# Altium footprint library PcbLib1.PcbLib: 209 footprints (part 11 of 14)
Each footprint in its own frame and in the unit in brackets; x right, y up, seen from the top. Pads: shape width x height; smd on the part's side, far side on the other; paste and mask are expansions set on the pad; w line width, h text height; cw(c..) or ccw(c..) is an arc to the next point about the centre after c.
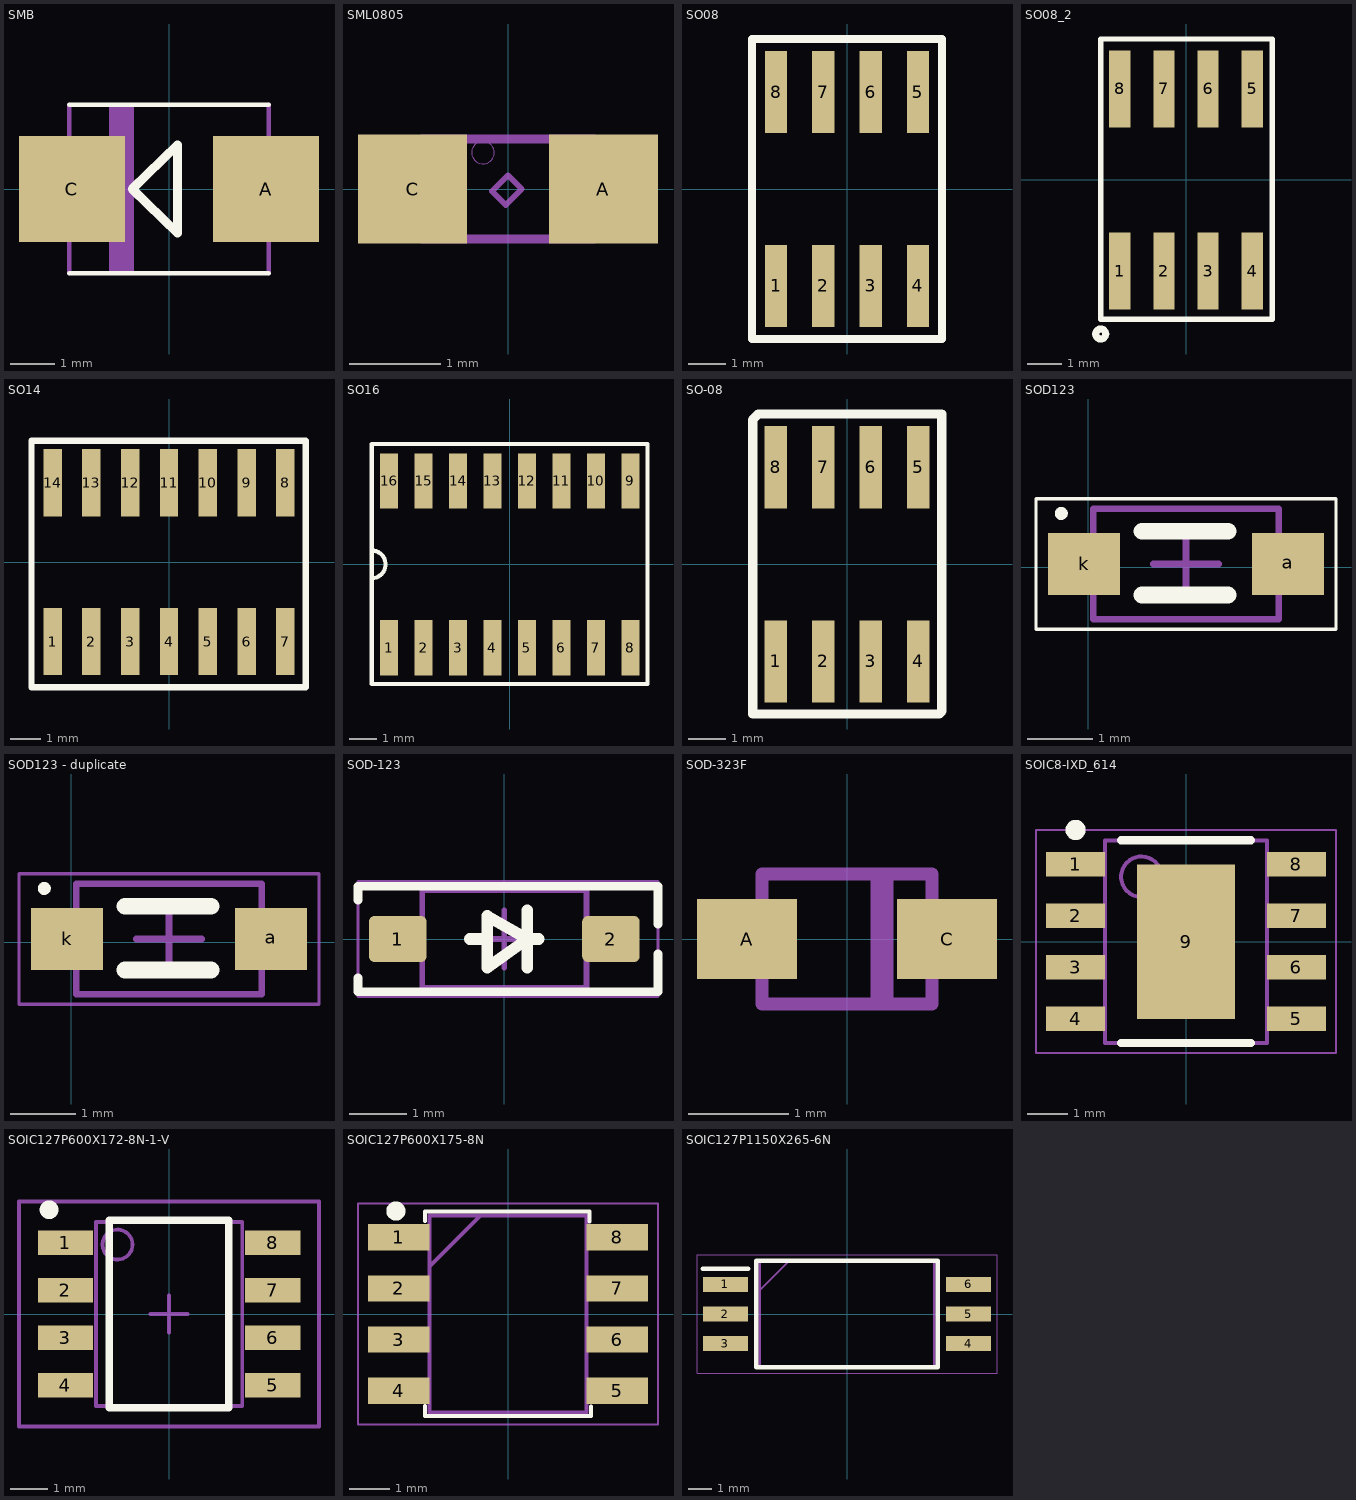
[diagram p10: the footprints below, top view; thin cyan lines are the x and y axes]

## SMB [mm] "SMB"
pads (2):
  rect 2.4x2.4 smd: A(2.2,0) C(-2.2,0)
Top Overlay:
  lines w0.102: -2.261,-1.905 2.261,-1.905 ; -2.261,1.905 2.261,1.905
  lines w0.203: -0.83,0 0.193,-1 0.193,1 -0.83,0
Bottom Assembly:
  region: -1.35,-1.9 -1.35,1.9 -0.8,1.9 -0.8,-1.9
  region: 2.261,-1.092 2.261,1.092 2.794,1.092 2.794,-1.092
  region: -2.794,-1.092 -2.794,1.092 -2.261,1.092 -2.261,-1.092
  lines w0.102: -2.261,-1.905 -2.261,1.905 ; 2.261,-1.905 2.261,1.905

## SML0805 [mm] "SML0805"
pads (2):
  rect 1.2x1.2 smd: A(1.05,0) C(-1.05,0)
Bottom Assembly:
  lines w0.102: -0.95,-0.55 -0.95,0.55 0.95,0.55 0.95,-0.55 -0.95,-0.55
Bottom 3D Body:
  circle w0: c-0.275,0.4 r0.125
  lines w0.064: -0.175,-0.025 -0.025,-0.175 0.15,0 0,0.15 -0.175,-0.025

## SO08 [mm] "SO08"
pads (8):
  rect 0.6x2.2 smd: 1(-1.905,-2.6) 2(-0.635,-2.6) 3(0.635,-2.6) 4(1.905,-2.6) 5(1.905,2.6) 6(0.635,2.6) 7(-0.635,2.6) 8(-1.905,2.6)
Top Overlay:
  lines w0.203: -2.55,-4.025 2.55,-4.025 2.55,-1.25 2.55,4.025 -2.55,4.025 -2.55,-1.25 -2.55,-4.025
Bottom Assembly:
  region: -2.15,2 -2.15,3.1 -1.66,3.1 -1.66,2
  region: -0.88,2 -0.88,3.1 -0.39,3.1 -0.39,2
  region: 0.39,2 0.39,3.1 0.88,3.1 0.88,2
  region: 1.66,2 1.66,3.1 2.15,3.1 2.15,2
  region: 1.66,-3.1 1.66,-2 2.15,-2 2.15,-3.1
  region: 0.39,-3.1 0.39,-2 0.88,-2 0.88,-3.1
  region: -0.88,-3.1 -0.88,-2 -0.39,-2 -0.39,-3.1
  region: -2.15,-3.1 -2.15,-2 -1.66,-2 -1.66,-3.1
3D body "SOIC08 narrow.stp": height 2, standoff 0, extent -2.45,-3.032 2.55,3.132

## SO08_2 [mil]
pads (8):
  rect 24x87 smd: 1(-75,-103) 2(-25,-103) 3(25,-103) 4(75,-103) 5(75,103) 6(25,103) 7(-25,103) 8(-75,103)
Top Overlay:
  circle w8: c-96.46,-174.21 r5.65
  lines w6: -96.46,-157.48 97.44,-157.48 97.44,159.45 -96.46,159.45 -96.46,-157.48
Bottom Assembly:
  region: -82,-113 -82,-73 -68,-73 -68,-113
  region: -32,-113 -32,-73 -18,-73 -18,-113
  region: 18,-113 18,-73 32,-73 32,-113
  region: 68,-113 68,-73 82,-73 82,-113
  region: -82,73 -82,113 -68,113 -68,73
  region: -32,73 -32,113 -18,113 -18,73
  region: 18,73 18,113 32,113 32,73
  region: 68,73 68,113 82,113 82,73
3D body "SOIC08 narrow.stp": height 69.4, standoff -9.21, extent -99.41,-119.35 97.44,123.29

## SO14 [mm] "SO14"
pads (14):
  rect 0.6x2.2 smd: 1(-3.81,-2.6) 2(-2.54,-2.6) 3(-1.27,-2.6) 4(0,-2.6) 5(1.27,-2.6) 6(2.54,-2.6) 7(3.81,-2.6) 8(3.81,2.6) 9(2.54,2.6) 10(1.27,2.6) 11(0,2.6) 12(-1.27,2.6) 13(-2.54,2.6) 14(-3.81,2.6)
Top Overlay:
  lines w0.203: -4.5,-4.1 4.475,-4.1 4.475,3.975 -4.5,3.975 -4.5,-4.1
Bottom Assembly:
  region: 1.025,2 1.025,3.1 1.515,3.1 1.515,2
  region: 2.295,2 2.295,3.1 2.785,3.1 2.785,2
  region: 3.565,2 3.565,3.1 4.055,3.1 4.055,2
  region: 3.565,-3.1 3.565,-2 4.055,-2 4.055,-3.1
  region: 2.295,-3.1 2.295,-2 2.785,-2 2.785,-3.1
  region: 1.025,-3.1 1.025,-2 1.515,-2 1.515,-3.1
  region: -4.055,2 -4.055,3.1 -3.565,3.1 -3.565,2
  region: -2.785,2 -2.785,3.1 -2.295,3.1 -2.295,2
  region: -1.515,2 -1.515,3.1 -1.025,3.1 -1.025,2
  region: -0.245,2 -0.245,3.1 0.245,3.1 0.245,2
  region: -0.245,-3.1 -0.245,-2 0.245,-2 0.245,-3.1
  region: -1.515,-3.1 -1.515,-2 -1.025,-2 -1.025,-3.1
  region: -2.785,-3.1 -2.785,-2 -2.295,-2 -2.295,-3.1
  region: -4.055,-3.1 -4.055,-2 -3.565,-2 -3.565,-3.1
3D body "SOIC14 narrow.stp": height 2, standoff 0, extent -4.405,-3.107 4.405,3.057

## SO16 [mil] "SO16"
pads (16):
  rect 26x80 smd: 1(-175,-121) 2(-125,-121) 3(-75,-121) 4(-25,-121) 5(25,-121) 6(75,-121) 7(125,-121) 8(175,-121) 9(175,121) 10(125,121) 11(75,121) 12(25,121) 13(-25,121) 14(-75,121) 15(-125,121) 16(-175,121)
Top Overlay:
  lines w6: -200,-20 ccw(c-200,0) -200,20 ; 200,-77 200,77 ; -200,-173.46 -200,-77 -200,174.44 200,174.44 200,-173.46 -183.03,-173.46 -200,-173.46
3D body "SOIC16 narrow.stp": height 78.74, standoff 0.13, extent -200.39,-122.31 196.46,120.34

## SO-08 [mm] "SO-08"
pads (8):
  rect 0.6x2.2 smd: 1(-1.905,-2.6) 2(-0.635,-2.6) 3(0.635,-2.6) 4(1.905,-2.6) 5(1.905,2.6) 6(0.635,2.6) 7(-0.635,2.6) 8(-1.905,2.6)
Top Overlay:
  lines w0.254: -2.525,-4.01 -2.1,-4.01 2.465,-4.01 2.533,-3.942 2.533,4.025 -2.375,4.025 -2.525,3.875 -2.525,-3.775 -2.525,-4.01
Bottom Assembly:
  region: -2.15,2 -2.15,3.1 -1.66,3.1 -1.66,2
  region: -0.88,2 -0.88,3.1 -0.39,3.1 -0.39,2
  region: 0.39,2 0.39,3.1 0.88,3.1 0.88,2
  region: 1.66,2 1.66,3.1 2.15,3.1 2.15,2
  region: 1.66,-3.1 1.66,-2 2.15,-2 2.15,-3.1
  region: 0.39,-3.1 0.39,-2 0.88,-2 0.88,-3.1
  region: -0.88,-3.1 -0.88,-2 -0.39,-2 -0.39,-3.1
  region: -2.15,-3.1 -2.15,-2 -1.66,-2 -1.66,-3.1
3D body: height 1.27, standoff 0, extent 1.605,1.5 2.205,3.7
3D body: height 1.27, standoff 0, extent 0.335,1.5 0.935,3.7
3D body: height 1.27, standoff 0, extent -2.205,1.5 -1.605,3.7
3D body: height 1.27, standoff 0, extent 1.605,-3.7 2.205,-1.5
3D body: height 1.27, standoff 0, extent 0.335,-3.7 0.935,-1.5
3D body: height 1.27, standoff 0, extent -2.205,-3.7 -1.605,-1.5
3D body: height 1.27, standoff 0, extent -0.935,1.5 -0.335,3.7
3D body: height 1.27, standoff 0, extent -0.935,-3.7 -0.335,-1.5
3D body: height 3.81, standoff 0, extent -2.15,2 -1.66,3.1
3D body: height 3.81, standoff 0, extent -0.88,2 -0.39,3.1
3D body: height 3.81, standoff 0, extent 0.39,2 0.88,3.1
3D body: height 3.81, standoff 0, extent 1.66,2 2.15,3.1
3D body: height 3.81, standoff 0, extent 1.66,-3.1 2.15,-2
3D body: height 3.81, standoff 0, extent 0.39,-3.1 0.88,-2
3D body: height 3.81, standoff 0, extent -0.88,-3.1 -0.39,-2
3D body: height 3.81, standoff 0, extent -2.15,-3.1 -1.66,-2
3D body "SOIC08 narrow.stp": height 2, standoff 0, extent 3.243,-1.675 9.407,3.325

## SOD123 [mm]
height 1.35
pads (2):
  rect 1.1x0.95 smd: a(3.063,0.05) k(-0.062,0.05)
Top Overlay:
  circle w0.1: c-0.412,0.825 r0.05
  lines w0.05: -0.8,-0.95 -0.8,1.05 3.8,1.05 3.8,-0.95 -0.8,-0.95
  lines w0.254: 0.825,-0.425 2.15,-0.425 ; 0.825,0.55 2.15,0.55
Top Courtyard:
  lines w0.1: 1,0.05 2,0.05 ; 1.5,-0.45 1.5,0.55
Top Assembly:
  lines w0.1: 0.075,-0.8 0.075,0.9 2.925,0.9 2.925,-0.8 0.075,-0.8
3D body "CircuitWorks-SOD123.STEP": height 1.28, standoff 0.01, extent -0.375,-0.775 3.325,0.825

## SOD123 - duplicate [mm]
height 1.35
pads (2):
  rect 1.1x0.95 smd: a(3.063,0.05) k(-0.062,0.05)
Top Overlay:
  circle w0.1: c-0.412,0.825 r0.05
  lines w0.254: 0.825,-0.425 2.15,-0.425 ; 0.825,0.55 2.15,0.55
Top Courtyard:
  lines w0.05: -0.8,-0.95 3.8,-0.95 3.8,1.05 -0.8,1.05 -0.8,-0.95
  lines w0.1: 1,0.05 2,0.05 ; 1.5,-0.45 1.5,0.55
Top Assembly:
  lines w0.1: 0.075,-0.8 2.925,-0.8 2.925,0.9 0.075,0.9 0.075,-0.8
3D body "CircuitWorks-SOD123.STEP": height 1.28, standoff 0.01, extent -0.375,-0.775 3.325,0.825

## SOD323 [mm]

## SOD-123 [mm] "SOD, 2-Leads, Body 1.55x3.70mm, IPC Medium Density"
height 1.35
pads (2):
  rrect25% 1x0.8 smd: 1(-1.85,0) 2(1.85,0)
Top Overlay:
  lines w0.15: -2.54,-0.675 -2.54,-0.916 2.286,-0.916 2.667,-0.916 2.667,-0.254 ; -2.54,0.675 -2.54,0.916 2.286,0.916 2.667,0.916 2.667,0.254
  lines w0.2: -0.6,0 -0.3,0 ; 0.4,-0.5 0.4,0.5 ; 0.6,0 0.4,0 ; 0.4,0 -0.3,-0.5 -0.3,0.4 0.4,0
Mechanical 13:
  lines w0.1: -1.425,-0.85 1.425,-0.85 1.425,0.85 -1.425,0.85 -1.425,-0.85
Mechanical 15:
  lines w0.05: -2.54,-1 2.667,-1 2.667,1 -2.54,1 -2.54,-1
  lines w0.1: -0.5,0 0.5,0 ; 0,-0.5 0,0.5
3D body "SOD123.STEP": height 1.18, standoff 0, extent -1.95,-0.9 1.95,0.9

## SOD-323F [mm] "SOD-323F"
pads (2):
  rect 1x0.8 smd: A(-1,0) C(1,0)
Bottom Assembly:
  lines w0.127: -0.9,-0.2 -1.2,-0.2 -1.2,0.2 -0.9,0.2 ; 0.9,-0.2 1.2,-0.2 1.2,0.2 0.9,0.2
Bottom 3D Body:
  lines w0.127: 0.3,0.6 0.3,-0.6 0.4,-0.6 0.4,0.6 ; -0.85,-0.65 0.85,-0.65 0.85,0.65 -0.85,0.65 -0.85,-0.65

## SOIC8-IXD_614 [mm]
height 1.7
pads (9):
  rect 1.45x0.6 smd: 1(-2.725,1.905) 2(-2.725,0.635) 3(-2.725,-0.635) 4(-2.725,-1.905) 5(2.725,-1.905) 6(2.725,-0.635) 7(2.725,0.635) 8(2.725,1.905)
  rect 2.41x3.81 smd: 9(0,0)
Top Overlay:
  circle w0.25: c-2.725,2.755 r0.125
  lines w0.2: -1.6,-2.5 1.6,-2.5 ; -1.6,2.5 1.6,2.5
Top Courtyard:
  lines w0.05: -3.7,-2.75 3.7,-2.75 3.7,2.75 -3.7,2.75 -3.7,-2.75
  lines w0.1: -0.5,0 0.5,0 ; 0,-0.5 0,0.5
Top Assembly:
  circle w0.1: c-1.1,1.6 r0.5
  lines w0.1: -2,-2.5 2,-2.5 2,2.5 -2,2.5 -2,-2.5
3D body "SOIC8-IXD_614.step": height 1.7, standoff 0, extent -3,-2.5 3,2.5

## SOIC127P600X172-8N-1-V [mm] "SOIC,1.27mm pitch;8 pin,3.90mm W X 4.90mm L X 1.72mm H body"
height 1.72
pads (8):
  rect 1.47x0.65 smd paste+0 mask+0: 1(-2.765,1.905) 2(-2.765,0.635) 3(-2.765,-0.635) 4(-2.765,-1.905) 5(2.765,-1.905) 6(2.765,-0.635) 7(2.765,0.635) 8(2.765,1.905)
Top Overlay:
  circle w0.25: c-3.2,2.78 r0.125
  lines w0.2: -1.6,-2.5 1.6,-2.5 1.6,2.5 -1.6,2.5 -1.6,-2.5
Bottom Assembly:
  text ".DESIGNATOR" at 0,0 h0.5
Mechanical 13:
  circle w0.1: c-1.372,1.852 r0.4
  lines w0.1: -1.95,-2.45 1.95,-2.45 1.95,2.45 -1.95,2.45 -1.95,-2.45
Mechanical 15:
  lines w0.1: -0.5,0 0.5,0 ; 0,-0.5 0,0.5 ; -4,-3 4,-3 4,3 -4,3 -4,-3
3D body "PG-DSO-8-69_Z8B00186941_V02_3D.STEP": height 1.73, standoff 0, extent -3,-2.45 3,2.45

## SOIC127P600X175-8N [mm]
pads (8):
  rect 1.525x0.65 smd: 1(-2.712,1.905) 2(-2.712,0.635) 3(-2.712,-0.635) 4(-2.712,-1.905) 5(2.712,-1.905) 6(2.712,-0.635) 7(2.712,0.635) 8(2.712,1.905)
Top Overlay:
  circle w0.254: c-2.785,2.556 r0.11
  lines w0.1: -2.066,2.307 -2.066,2.549 2.023,2.549 2.023,2.301 ; -2.061,-2.286 -2.061,-2.529 2.066,-2.529 2.066,-2.295
Mechanical 13:
  lines w0.1: -1.95,1.18 -0.68,2.45 ; -1.95,-2.45 -1.95,2.45 1.95,2.45 1.95,-2.45 -1.95,-2.45
Mechanical 15:
  lines w0.05: -3.725,-2.75 -3.725,2.75 3.725,2.75 3.725,-2.75 -3.725,-2.75
3D body "NE555DR.stp": height 1.75, standoff 0, extent -3,-2.45 3,2.45

## SOIC127P1150X265-6N [mm]
pads (6):
  rect 1.95x0.65 smd: 1(-5.225,1.27) 2(-5.225,0) 3(-5.225,-1.27) 4(5.225,-1.27) 5(5.225,0) 6(5.225,1.27)
Top Overlay:
  lines w0.2: -6.2,1.945 -4.25,1.945 ; -3.9,-2.29 3.9,-2.29 3.9,2.29 -3.9,2.29 -3.9,-2.29
Mechanical 13:
  lines w0.1: -3.75,1.02 -2.48,2.29 ; -3.75,-2.29 3.75,-2.29 3.75,2.29 -3.75,2.29 -3.75,-2.29
Mechanical 15:
  lines w0.05: -6.45,-2.54 6.45,-2.54 6.45,2.54 -6.45,2.54 -6.45,-2.54
3D body "Si8261ACD-C-IS.stp": height 2.65, standoff 0, extent -5.75,-2.29 5.75,2.29